# Altium footprint library GZ7_1_x.PcbLib: 61 footprints (part 1 of 4)
Each footprint in its own frame and in the unit in brackets; x right, y up, seen from the top. Pads: shape width x height; smd on the part's side, far side on the other; paste and mask are expansions set on the pad; w line width, h text height; cw(c..) or ccw(c..) is an arc to the next point about the centre after c.
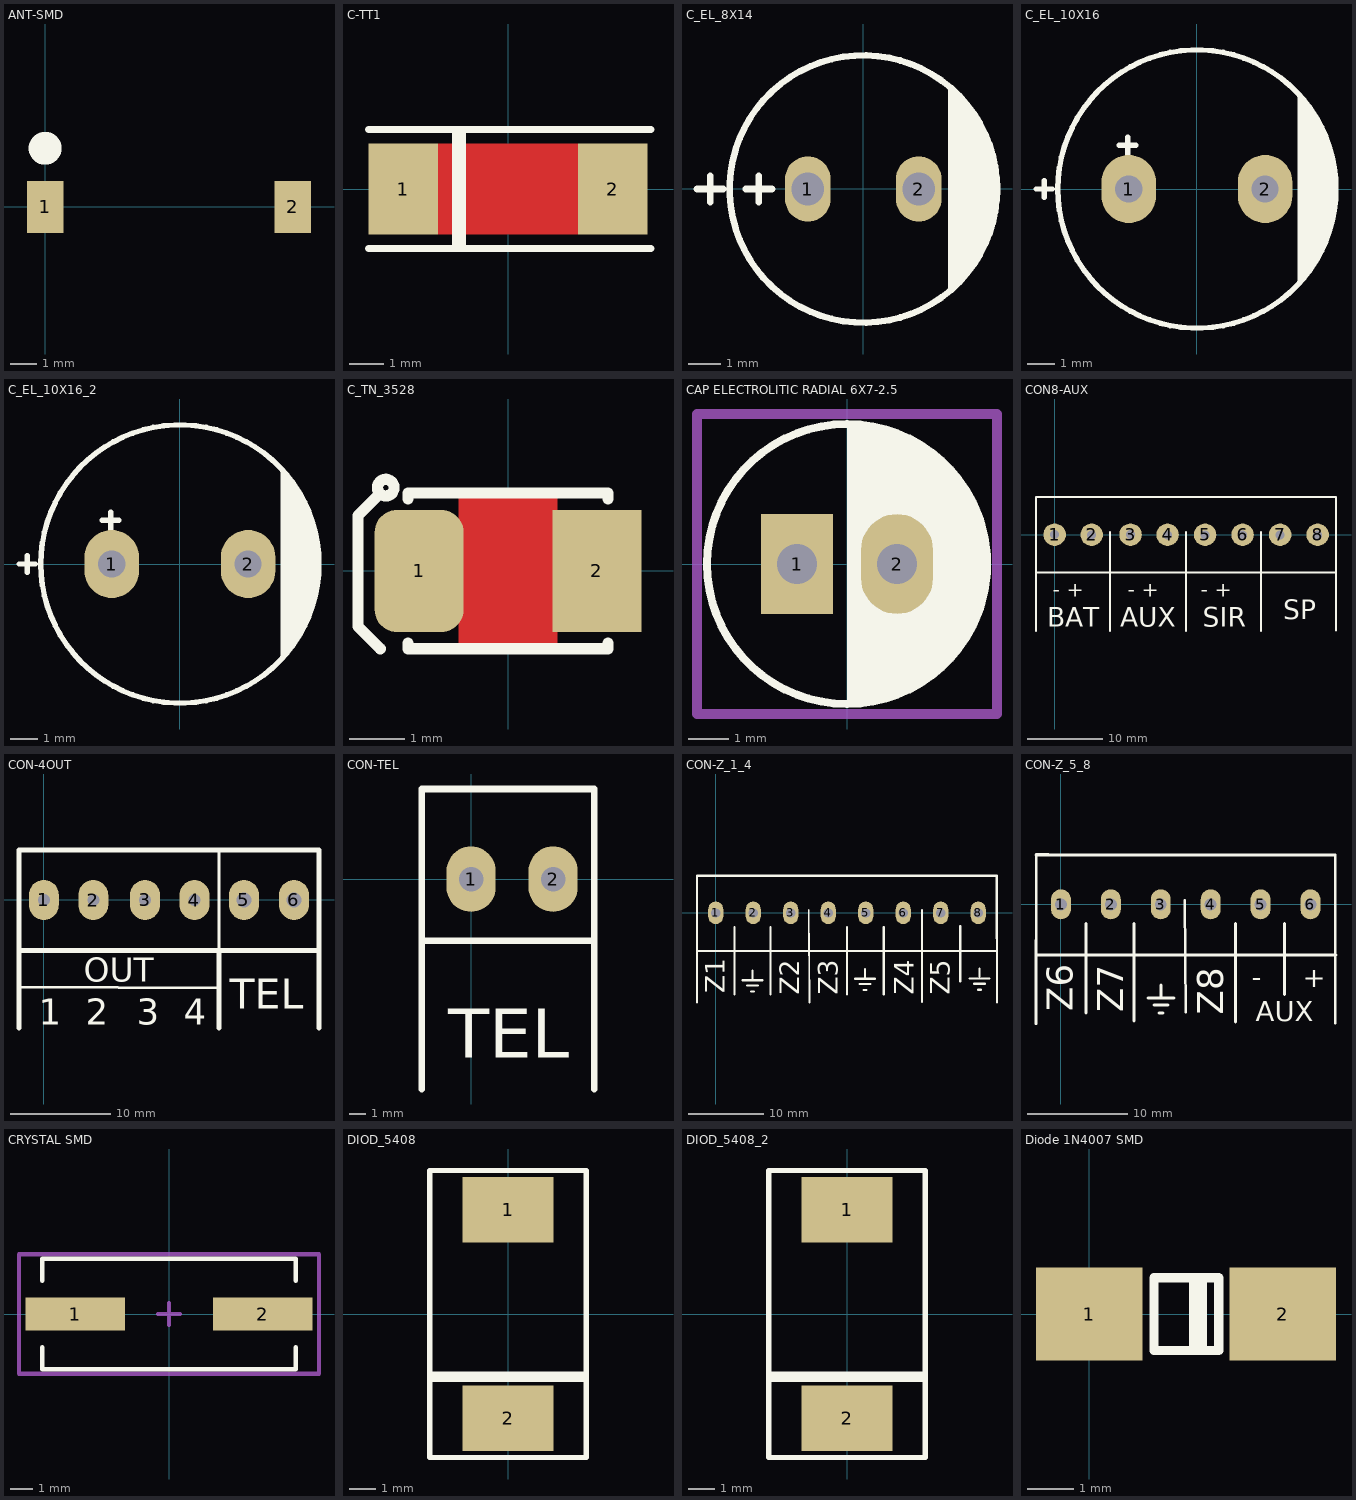
[diagram p0: the footprints below, top view; thin cyan lines are the x and y axes]

## ANT-SMD [mm]
pads (2):
  rect 1.4x2 smd: 1(0,0) 2(9.5,0)
Top Overlay:
  circle w1: c0,2.25 r0.127
3D body "AN9520.STEP": height 1.06, standoff 0.01, extent 0.076,-1.05 9.576,1.05

## C-TT1 [mm]
height 2.54
pads (2):
  rect 2x2.6 smd: 1(-3,0) 2(3,0)
Top Layer:
  pour cut-out: 2,1.3 -2,1.3 -2,-1.3 2,-1.3
Top Overlay:
  lines w0.2: -4,-1.7 4.1,-1.7 ; -4,1.7 4.1,1.7 ; -1.5,-1.7 -1.5,1.7 ; -1.4,1.7 -1.3,1.7 -1.3,-1.7
3D body "C_case.STEP": height 2.7, standoff 0, extent -3.05,-1.675 3.05,1.675

## C_EL_8X14 [mm] "Capacitor Electrolythic, D8X14H pitch: 3.5mm"
height 14
pads (2):
  oval 1.4x2 hole 1: 1(-1.7,0) 2(1.7,0)
Top Overlay:
  circle w0.2: c0,0 r4.1
  region: 2.6,-3.172 2.775,-3.028 3.092,-2.703 3.371,-2.346 3.609,-1.959 3.803,-1.549 3.951,-1.12 4.05,-0.678 4.1,-0.227 4.1,0 2.6,0
  region: 2.6,3.172 2.775,3.028 3.092,2.703 3.371,2.346 3.609,1.959 3.803,1.549 3.951,1.12 4.05,0.678 4.1,0.227 4.1,0 2.6,0
  lines w0.2: -5.1,0 -4.3,0 ; -4.7,-0.4 -4.7,0.4 ; -3.6,0 -2.8,0 ; -3.2,-0.4 -3.2,0.4
3D body "User Library-CAP-EL8X14_R150_D320_H570.STEP": height 14.6, standoff -2.7, extent -4.095,-4.1 4.1,4.1

## C_EL_10X16 [mm] "Capacitor Electrolythic, D10.0X16.0H pitch: 5.0mm"
height 16
pads (2):
  oval 2x2.5 hole 1: 1(-2.5,0) 2(2.5,0)
Top Overlay:
  circle w0.2: c0,0 r5.1
  region: 3.7,-3.38 3.866,-3.214 4.164,-2.851 4.425,-2.46 4.646,-2.046 4.826,-1.612 4.962,-1.163 5.054,-0.702 5.1,-0.235 5.1,0 3.7,0
  region: 3.7,3.38 3.866,3.214 4.164,2.851 4.425,2.46 4.646,2.046 4.826,1.612 4.962,1.163 5.054,0.702 5.1,0.235 5.1,0 3.7,0
  lines w0.2: -5.9,0 -5.3,0 ; -5.6,-0.3 -5.6,0.3 ; -2.84,1.6 -2.24,1.6 ; -2.54,1.3 -2.54,1.9
3D body "User Library-Cap-EL(10x16-5).step": height 16, standoff -3.3, extent -5,-5 5.002,5

## C_EL_10X16_2 [mm]
pads (2):
  oval 2x2.5 hole 1: 1(-2.5,0) 2(2.5,0)
Top Overlay:
  circle w0.2: c0,0 r5.1
  region: 3.7,-3.38 3.866,-3.214 4.164,-2.851 4.425,-2.46 4.646,-2.046 4.826,-1.612 4.962,-1.163 5.054,-0.702 5.1,-0.235 5.1,0 3.7,0
  region: 3.7,3.38 3.866,3.214 4.164,2.851 4.425,2.46 4.646,2.046 4.826,1.612 4.962,1.163 5.054,0.702 5.1,0.235 5.1,0 3.7,0
  lines w0.2: -5.9,0 -5.3,0 ; -5.6,-0.3 -5.6,0.3 ; -2.84,1.6 -2.24,1.6 ; -2.54,1.3 -2.54,1.9
3D body "User Library-Cap-EL(10x16-5).step": height 16, standoff -3.3, extent -5,-5 5.002,5

## C_TN_3528 [mm]
pads (2):
  rrect50% 1.6x2.2 smd mask+0.1: 1(-1.6,0)
  rect 1.6x2.2 smd mask+0.1: 2(1.6,0)
Top Layer:
  pour cut-out: -0.889,1.4 -0.889,-1.4 0.889,-1.4 0.889,1.4
Top Overlay:
  circle w0.2: c-2.2,1.5 r0.15
  lines w0.2: -2.35,1.35 -2.7,1 -2.7,-1 -2.3,-1.4 ; -1.8,-1.3 -1.8,-1.4 1.8,-1.4 1.8,-1.3 ; -1.8,1.3 -1.8,1.4 1.8,1.4 1.8,1.3
3D body "User Library-AVX_BCASE.step": height 2.03, standoff 0, extent -1.85,-1.465 1.85,1.465

## CAP ELECTROLITIC RADIAL 6X7-2.5 [mm] "Cap electrolitic radial 6x7-2.5-Design:Abbas Basereh"
height 7
pads (2):
  rect 1.8x2.5 hole 1: 1(-1.25,0)
  oval 1.8x2.5 hole 1: 2(1.25,0)
Top Overlay:
  circle w0.2: c0,0 r3.5
  region: 0,3.5 0.096,3.5 0.325,3.5 0.78,3.44 1.223,3.321 1.647,3.146 2.045,2.916 2.409,2.637 2.733,2.313 3.012,1.949 3.242,1.551 3.417,1.127 3.536,0.684 3.596,0.229 3.596,0 3.596,-0.229 3.536,-0.684 3.417,-1.127 3.242,-1.551 3.012,-1.949 2.733,-2.313 2.409,-2.637 2.045,-2.916 1.647,-3.146 1.223,-3.321 0.78,-3.44 0.325,-3.5 0.096,-3.5 0,-3.5
Mechanical 15:
  lines w0.254: -3.75,-3.75 3.75,-3.75 3.75,3.75 -3.75,3.75 -3.75,-3.75
3D body "User Library-Cap electrolitic radial 6x7.STEP": height 7.3, standoff -1.2, extent -2.999,-2.999 2.999,2.998

## CON8-AUX [mm]
pads (8):
  round 3 / inner oval 3x5 / far side oval 3x4 hole 1.2: 1(0,0) 3(10.112,0)
  round 3 / inner oval 3x4 / far side oval 3x4 hole 1.2: 2(4.938,-0.012)
  round 3 / inner oval 3x5 / far side oval 3x5 hole 1.2: 4(15.05,-0.012) 5(20.05,-0.012) 6(25.05,-0.012) 7(30.05,-0.012) 8(35.05,-0.012)
Top Overlay:
  lines w0.2: -2.484,2.286 -2.484,5 ; 37.5,-12.8 37.5,5
  lines w0.25: -2.2,5 37.5,5 37.5,-12.8
  lines w0.254: -2.484,-12.118 -2.484,5 ; -1.276,5 -2.484,5 ; 7.4,0.388 7.4,-12.818 7.4,-5.054 ; 7.716,-5.054 -2.484,-5.054 ; 17.5,-12.818 17.5,-5.054 27.5,-5.054 27.5,-12.818 ; 17.5,-7.1 17.5,0.388 ; 27.5,-7.3 27.5,0.388 ; 37.5,-5.054 7.4,-5.054 ; -2.484,-5.054 -2.484,-12.818 -2.484,5 ; -2.484,-5.054 7.4,-5.054 ; -2.484,-5.054 -2.484,5
  text "- +" at -0.25,-8.25 h2
  text "- +" at 9.75,-8.25 h2
  text "BAT" at -1,-12.25 h2.6
  text "SP" at 30.5,-11.25 h2.6
  text "AUX" at 8.75,-12.25 h2.6
  text "SIR" at 19.75,-12.25 h2.6
  text "- +" at 19.5,-8.25 h2
3D body "KF128-2P.STEP": height 14.15, standoff -3.8, extent 26.95,-5.312 37.55,4.988
3D body "KF128-2P.STEP": height 14.15, standoff -3.8, extent 16.95,-5.312 27.55,4.988
3D body "KF128-2P.STEP": height 14.15, standoff -3.8, extent 7.012,-5.3 17.612,5
3D body "KF128-2P.STEP": height 14.15, standoff -3.8, extent -3.1,-5.3 7.5,5

## CON-4OUT [mm]
pads (6):
  oval 3x4 hole 1.2: 1(0,0) 2(4.938,-0.012) 3(10.112,0) 4(15.05,-0.012)
  oval 3x4 hole 1.5: 5(20,0) 6(25,0)
Top Overlay:
  lines w0.2: -2.484,2.286 -2.484,5
  lines w0.254: -2.484,-12.118 -2.484,5 ; -1.276,5 -2.484,5 ; 7.4,-5.054 -2.484,-5.054 ; 7.716,-5.054 -2.484,-5.054 ; -2.484,-5.054 -2.484,5 ; -2.484,-5.054 -2.484,-12.818 -2.484,5
  lines w0.3: -2.484,5 17.5,5 ; -2.4,-8.7 17.3,-8.8 ; 7.5,-5.054 17.5,-5.054 17.5,5 ; 17.5,-12.8 17.5,0 ; 27.5,-12.8 27.5,5 17.5,5
  lines w0.4: 17.5,-5 27.5,-5 ; 27.5,-12.8 27.5,5
  lines w0.5: -2.484,-12.818 -2.484,5 27.5,5 27.5,-12.8 ; -2.484,-5.054 27.5,-5.054 ; 17.5,-12.8 17.5,-5.054
  text "TEL" at 18.6,-10.9 h3
  text "4" at 14,-12.5 h2.6
  text "2" at 4.2,-12.5 h2.6
  text "3" at 9.3,-12.5 h2.6
  text "1" at -0.5,-12.5 h2.6
  text "OUT" at 4,-8.2 h2.4
3D body "KF128-2P.STEP": height 14.15, standoff -3.8, extent 16.9,-5.3 27.5,5
3D body "KF128-2P.STEP": height 14.15, standoff -3.8, extent -3.1,-5.3 7.5,5
3D body "KF128-2P.STEP": height 14.15, standoff -3.8, extent 7.012,-5.3 17.612,5

## CON-TEL [mm]
height 1.524
pads (2):
  oval 3x4 hole 1.5: 1(0,0) 2(5,0)
Top Overlay:
  lines w0.2: -3,-12.8 -3,-12.3 -3,-2.5
  lines w0.3: -3,-12.8 -3,5.5 ; 7.4,5.5 7.5,5.5 7.5,-12.8
  lines w0.4: -3,-12.8 -3,5.5 ; -3,-3.75 7.5,-3.75 ; -3,4.8 -3,5.5 ; 7.5,-12.8 7.5,5.5 -3,5.5
  text "TEL" at -1.4,-10.9 h3
3D body "KF128-2P.STEP": height 14.15, standoff -3.8, extent -3.1,-5.3 7.5,5

## CON-Z_1_4 [mm]
pads (8):
  oval 2x3 / inner round 0 / far side oval 3x5 hole 1.2: 1(0,0) 2(5,0) 3(10,0) 4(15,0) 5(20,0) 6(25,0) 7(30,0) 8(35,0)
Top Overlay:
  lines w0.2: -2.484,2.286 -2.484,5
  lines w0.254: -2.484,4.953 -2.5,-11.95 -2.484,-5.054 ; -1.276,5 -2.484,5 -2.484,-5.054 ; 7.4,-5.054 -2.484,-5.054 ; 7.716,-5.054 -2.484,-5.054 ; 12.4,0.388 12.514,-11.973 ; 17.5,-5.054 27.5,-5.054 ; 27.5,-11.925 27.5,0.388
  lines w0.3: -2.484,-5.054 -2.484,-5.1 37.5,-5.1 ; -2.484,4.953 37.465,4.953 37.5,-11.95 ; 2.5,-10.9 2.5,-1.9 ; 3.6,-9 6.2,-9 ; 4.2,-9.7 5.6,-9.7 ; 4.7,-10.5 5.1,-10.5 ; 4.9,-9 4.9,-7.7 ; 7.3,-10.9 7.3,-1.9 ; 17.508,-10.9 17.508,-1.9 ; 18.6,-8.8 21.2,-8.8 ; 19.2,-9.5 20.6,-9.5 ; 19.7,-10.3 20.1,-10.3 ; 19.9,-8.8 19.9,-7.5 ; 22.4,-10.9 22.4,-1.9 ; 32.6,-9.144 32.6,-1.8 ; 33.879,-8.763 36.479,-8.763 ; 34.479,-9.463 35.879,-9.463 ; 34.979,-10.263 35.379,-10.263 ; 35.179,-8.494 35.179,-7.463
  text "Z5" at 31.226,-10.9 h2.6
  text "Z4" at 26.4,-10.9 h2.6
  text "Z3" at 16.3,-10.9 h2.6
  text "Z2" at 11.1,-10.9 h2.6
  text "Z1" at 1.2,-10.7 h2.6
3D body "KF128-2P.STEP": height 14.15, standoff -3.8, extent -3.1,-5.3 7.5,5
3D body "KF128-2P.STEP": height 14.15, standoff -3.8, extent 7.012,-5.3 17.612,5
3D body "KF128-2P.STEP": height 14.15, standoff -3.8, extent 16.95,-5.312 27.55,4.988
3D body "KF128-2P.STEP": height 14.15, standoff -3.8, extent 26.95,-5.312 37.55,4.988

## CON-Z_5_8 [mm]
pads (6):
  oval 2x3 / inner round 0 / far side oval 3x5 hole 1.2: 1(0,0) 2(5,0) 3(10,0) 4(15,0) 5(20,0) 6(25,0)
Top Overlay:
  lines w0.2: -2.484,2.286 -2.484,5
  lines w0.254: -2.484,4.953 -2.5,-11.95 -2.484,-5.054 ; -1.276,5 -2.484,5 -2.484,-5.054 ; 7.4,-5.054 -2.484,-5.054 ; 7.716,-5.054 -2.484,-5.054 ; 12.4,0.388 12.503,-10.797 ; 17.5,-5.054 27.5,-5.054 ; 27.5,-11.925 27.5,4.953
  lines w0.3: -2.484,-5.054 -2.484,-5.1 27.559,-5.1 ; -2.484,4.953 27.432,4.953 ; 2.5,-10.9 2.5,-1.9 ; 7.3,-11.684 7.3,-1.9 ; 8.733,-9.398 11.333,-9.398 ; 9.333,-10.098 10.733,-10.098 ; 9.833,-10.898 10.233,-10.898 ; 10.033,-9.398 10.033,-8.098 ; 17.508,-11.811 17.508,-1.9 ; 22.4,-9.017 22.4,-1.9
  text "-" at 19.123,-8.277 h2
  text "+" at 24.203,-8.309 h2
  text "AUX" at 19.504,-11.738 h2
  text "Z8" at 16.256,-11.049 h2.6
  text "Z7" at 6.223,-10.795 h2.6
  text "Z6" at 1.2,-10.7 h2.6
3D body "KF128-2P.STEP": height 14.15, standoff -3.8, extent -3.1,-5.3 7.5,5
3D body "KF128-2P.STEP": height 14.15, standoff -3.8, extent 7.012,-5.3 17.612,5
3D body "KF128-2P.STEP": height 14.15, standoff -3.8, extent 16.95,-5.312 27.55,4.988

## CRYSTAL SMD [mm] "DESIGNER ABBAS BASEREH"
height 4
pads (2):
  rect 4.5x1.5 smd: 1(-4.25,0) 2(4.25,0)
Top Overlay:
  lines w0.2: -5.75,-1.5 -5.75,-2.5 5.75,-2.5 5.75,-1.5 ; -5.75,1.5 -5.75,2.5 5.75,2.5 5.75,1.5
Mechanical 15:
  lines w0.2: -0.5,0 0.5,0 ; 0,-0.5 0,0.5 ; -6.8,-2.7 -6.8,2.7 6.8,2.7 6.8,-2.7 -6.8,-2.7
3D body "User Library-HC49_SMD.STEP": height 5.18, standoff 0, extent -6.209,-2.25 6.091,2.25

## DIOD_5408 [mm] "DO-214-AA/SMB; 2 C-Bend Leads; Body 5.3 x 3.6 mm, inc. leads (LxW)"
height 2.54
pads (2):
  rect 3.5x2.5 smd: 1(0,4) 2(0,-4)
Top Overlay:
  lines w0.2: -3,-2.5 3,-2.5 ; -3,-2.3 3,-2.3 ; -3,-5.5 3,-5.5 3,5.5 -3,5.5 -3,-5.5
3D body "ss34.stp": height 2.54, standoff 0.01, extent -2.95,-4.038 2.95,4.038

## DIOD_5408_2 [mm]
pads (2):
  rect 3.5x2.5 smd: 1(0,4) 2(0,-4)
Top Overlay:
  lines w0.2: -3,-2.5 3,-2.5 ; -3,-2.3 3,-2.3 ; -3,-5.5 3,-5.5 3,5.5 -3,5.5 -3,-5.5
3D body "ss34.stp": height 2.54, standoff 0.01, extent -2.95,-4.038 2.95,4.038

## Diode 1N4007 SMD [mm] "DO-214AC 1N4001-4007"
height 15
pads (2):
  rect 2.3x2 smd: 1(0,0) 2(4.175,0)
Top Overlay:
  rectangle: 2.156,-0.81 2.537,0.827
  lines w0.2: 1.395,-0.787 2.792,-0.787 2.792,0.78 1.395,0.78 1.395,-0.787
3D body "User Library-DO-214AC_SMA.step": height 2.16, standoff -0.04, extent -0.54,-1.36 4.46,1.34